# Altium integrated library vme6U_carrier_Cyc_V_SoC.IntLib: 56 symbols (continued)
## LQH32PN4R7NN0L
designator L?  value 4.7uH  (hidden comment: LQH32PN4R7NN0L)
Inductor, Fixed, 1210, 4.7uH, 216mOhm, 1A, 30%; Pkg: 1210; Vendor: Murata; Maintainer: Evgeniy Kotov; SMD Solders: 2; THD Solders: 0; DC Current: 750mA; Tolerance: 20%; DC Resistance: 380mΩ; PartField: LQH32PN4R7NN0L; Release Date: 30.03.2017; Last Change Data: 30.03.2017; Temperature Range: -40°C to +105°C
simulation model Inductor (Generic Inductor)
footprint IND_3225_MURATA_LQH_N (SMD Inductor, EIA 1206, Metric 3225,  Body Width 1.55mm, Body Lenght 3.2mm, Height 2.5mm)
footprint IND1608_COIL
pins: 1, 2

## MMBD1503
designator D?
High Conductance Low Leakage Diode; SolderOption: 0; Pkg: SOT-3N; SMD Solders: 3; HelpURL: https://www.engineering.uiowa.edu/sites/default/files/ees/files/NI/pdfs/01/30/DS013013.pdf; Value: MMBD1503; PartField: MMBD1503; THD Solders: 0
footprint SOT95P280X115-3N (SOT23, 0.95mm, pitch;3 pin,1.55mm W X 2.95mm L X 1.15mm H body, IPC Medium Density)
pins: 1, 2, 3

## MOLEX-74441-0001
designator J?, comment 74441-0001
CONN SFP+ RCPT 20POS SLD R/A SMD; Pkg: SMD SFP conn; SMD Solders: 20; THD Solders: 0; RoHSCompliant: True; ComponentLink3URL: http://www.molex.com/pdm_docs/sd/747540101_sd.pdf; Width: 49 mm; Height: 10.85 mm; Mounting Technology: Through Hole; ComponentLink2Description: Datasheet; ComponentLink3Description: Package Specification; DatasheetVersion: Rev. Jul-15; Package Quantity: 1152; PackageDescription: CONN SFP+ RCPT 20POS SLD R/A SMD; Radiation Hardening: No; PackageVersion: Rev. J, 02/2015; ComponentLink1Description: Manufacturer URL; PartNumber: 74441-0001; ComponentLink1URL: http://www.molex.com/; Packaging: Tray; Length: 15.9 mm; ComponentLink2URL: http://www.molex.com/webdocs/datasheets/pdf/en-us/0747540101_IO_CONNECTORS.pdf; Value: 74441-0001; PartField: 74441-0001
footprint MOLEX_74441-0001 (20 Position, Pitch 0.8mm SFP+ Receptacle (Small Form-factor Pluggable))
pins: 1 GND, 2 TxFault (out), 3 TxDis, 4 SDA, 5 SCL, 6 ~{Mod}Abs (out), 7 RS0(RX), 8 RxLos (out), 9 RS1(TX), 10 GND, 11 GND, 12 RD-, 13 RD+, 14 GND, 15 VCCR, 16 VCCT, 17 GND, 18 TD+, 19 TD-, 20 GND

## MOLX-74754-0101
designator J?, comment 74754-0101
SFP+ Cage, Single Port, Height 10.85 mm, Tail Height 3.05 mm, -40 to 85 degC, RoHS, Tray; Pkg: SFP cage; SMD Solders: 0; THD Solders: 20; RoHSCompliant: True; ComponentLink3URL: http://www.molex.com/pdm_docs/sd/747540101_sd.pdf; Width: 49 mm; Height: 10.85 mm; Mounting Technology: Through Hole; ComponentLink2Description: Datasheet; ComponentLink3Description: Package Specification; DatasheetVersion: Rev. Jul-15; Package Quantity: 1152; PackageDescription: SFP+ Cage, Single Port, Height 10.85 mm, Tail Height 3.05 mm; Radiation Hardening: No; PackageVersion: Rev. J, 02/2015; ComponentLink1Description: Manufacturer URL; PartNumber: 74754-0101; ComponentLink1URL: http://www.molex.com/; Packaging: Tray; Length: 15.9 mm; ComponentLink2URL: http://www.molex.com/webdocs/datasheets/pdf/en-us/0747540101_IO_CONNECTORS.pdf; Value: 74754-0101; PartField: 74754-0101
footprint MOLEX_74737-0111 (SFP+ 1x1 Cage)
pins: 1, 2, 3, 4, 5, 6, 7, 8, 9, 10, 11, 12, 13, 14, 15, 16, 17, 18, 19, 20

## MTFC32GAKAENA
designator U?, comment MTFC8GACAEDQ-AAT TR
Pkg: LBGA-100; SMD Solders: 100; THD Solders: 0; Value: MTFC8GACAEDQ-AAT TR; PartField: MTFC8GACAEDQ-AAT TR
footprint BGA100C100P10X17_1400X1800X120 (BGA 100 ball for e*MMC)
part A pins: K2 DAT0, K3 DAT2, K5 DS, K8 DAT4, K9 DAT7, M5 ~{RST}, N2 DAT1, N3 DAT3, N8 DAT4, N9 DAT6, P5 CMD, P6 CLK
part B pins: E4 VDDI, F2 VCC, F3 VCC, F4 VCC, F5 VCC, F6 VCC, F7 VCC, F8 VCC, F9 VCC, G2 GND, G3 GND, G4 GND, G5 GND, G6 GND, G7 GND, G8 GND, G9 GND, H2 GNDQ, H3 VCCQ, H8 VCCQ, H9 GNDQ, J5 GND, L2 VCCQ, L3 GNDQ, L4 VCCQ, L7 VCCQ, L8 GNDQ, L9 VCCQ, M4 GNDQ, M7 GNDQ, P2 GNDQ, P3 VCCQ, P8 VCCQ, P9 GNDQ
part C pins: A1 NC, A2 NC, A9 NC, A10 NC, B1 NC, B10 NC, D2 RFU, D3 RFU, D4 RFU, D5 RFU, D6 RFU, D7 RFU, D8 RFU, D9 RFU, E2 RFU, E3 RFU, E5 RFU, E6 RFU, E7 RFU, E8 RFU, E9 RFU, H4 RFU, H5 RFU, H6 RFU, H7 RFU, J2 RFU, J3 RFU, J4 RFU, J6 RFU, J7 RFU, J8 RFU, J9 RFU, K4 RFU, K6 RFU, K7 RFU, L5 RFU, L6 RFU, M2 RFU, M3 RFU, M6 RFU, M8 RFU, M9 RFU, N4 RFU, N5 RFU, N6 RFU, N7 RFU, P4 RFU, P7 RFU, T1 NC, T10 NC, U1 NC, U2 NC, U9 NC, U10 NC

## PCA9534PW
designator U?
8-Bit I2C-Bus and SMBus Low Power I/O Port with Interrupt; Manufacturer: ANALOG DEVICES; PressFit: No; Bonding: No; Pkg: SSOP16; SMD Solders: 16; THD Solders: 0; Part Number: PCA9534PW; Component Kind: Standard; Component Type: Standard; Device: PCA9534PW; Footprint: SOP65P640X110-16N; PackageDescription: SOP, 0.65mm pitch; 16 pin, 4.40mm W X 5.00mm L X 1.10mm H body IPC Medium Density; Part Description: 8-Bit I2C-Bus and SMBus Low Power I/O Port with Interrupt; Manufacturer Part Number: PCA9534PW; Pin Count: 16; Case: SSOP16; Mounted: Yes; Socket: No; SMD: Yes; ComponentHeight: 1.1mm; Author: CERN DEM JLC; HelpURL: \\cern.ch\dfs\Applications\Altium\Datasheets\PCA9534PW.pdf; CreateDate: 18/12/2013; LatestRevisionDate: 18/12/2013; Sense: No; Value: PCA9534PW; PartField: PCA9534PW
footprint SOP65P640X110-16N
pins: 1 A0 (in), 2 A1 (in), 3 A2 (in), 4 IO0 (io), 5 IO1 (io), 6 IO2 (io), 7 IO3 (io), 8 VSS (power), 9 IO4 (io), 10 IO5 (io), 11 IO6 (io), 12 IO7 (io), 13 ~{INT} (out), 14 SCL (in), 15 SDA (io), 16 VDD (io)

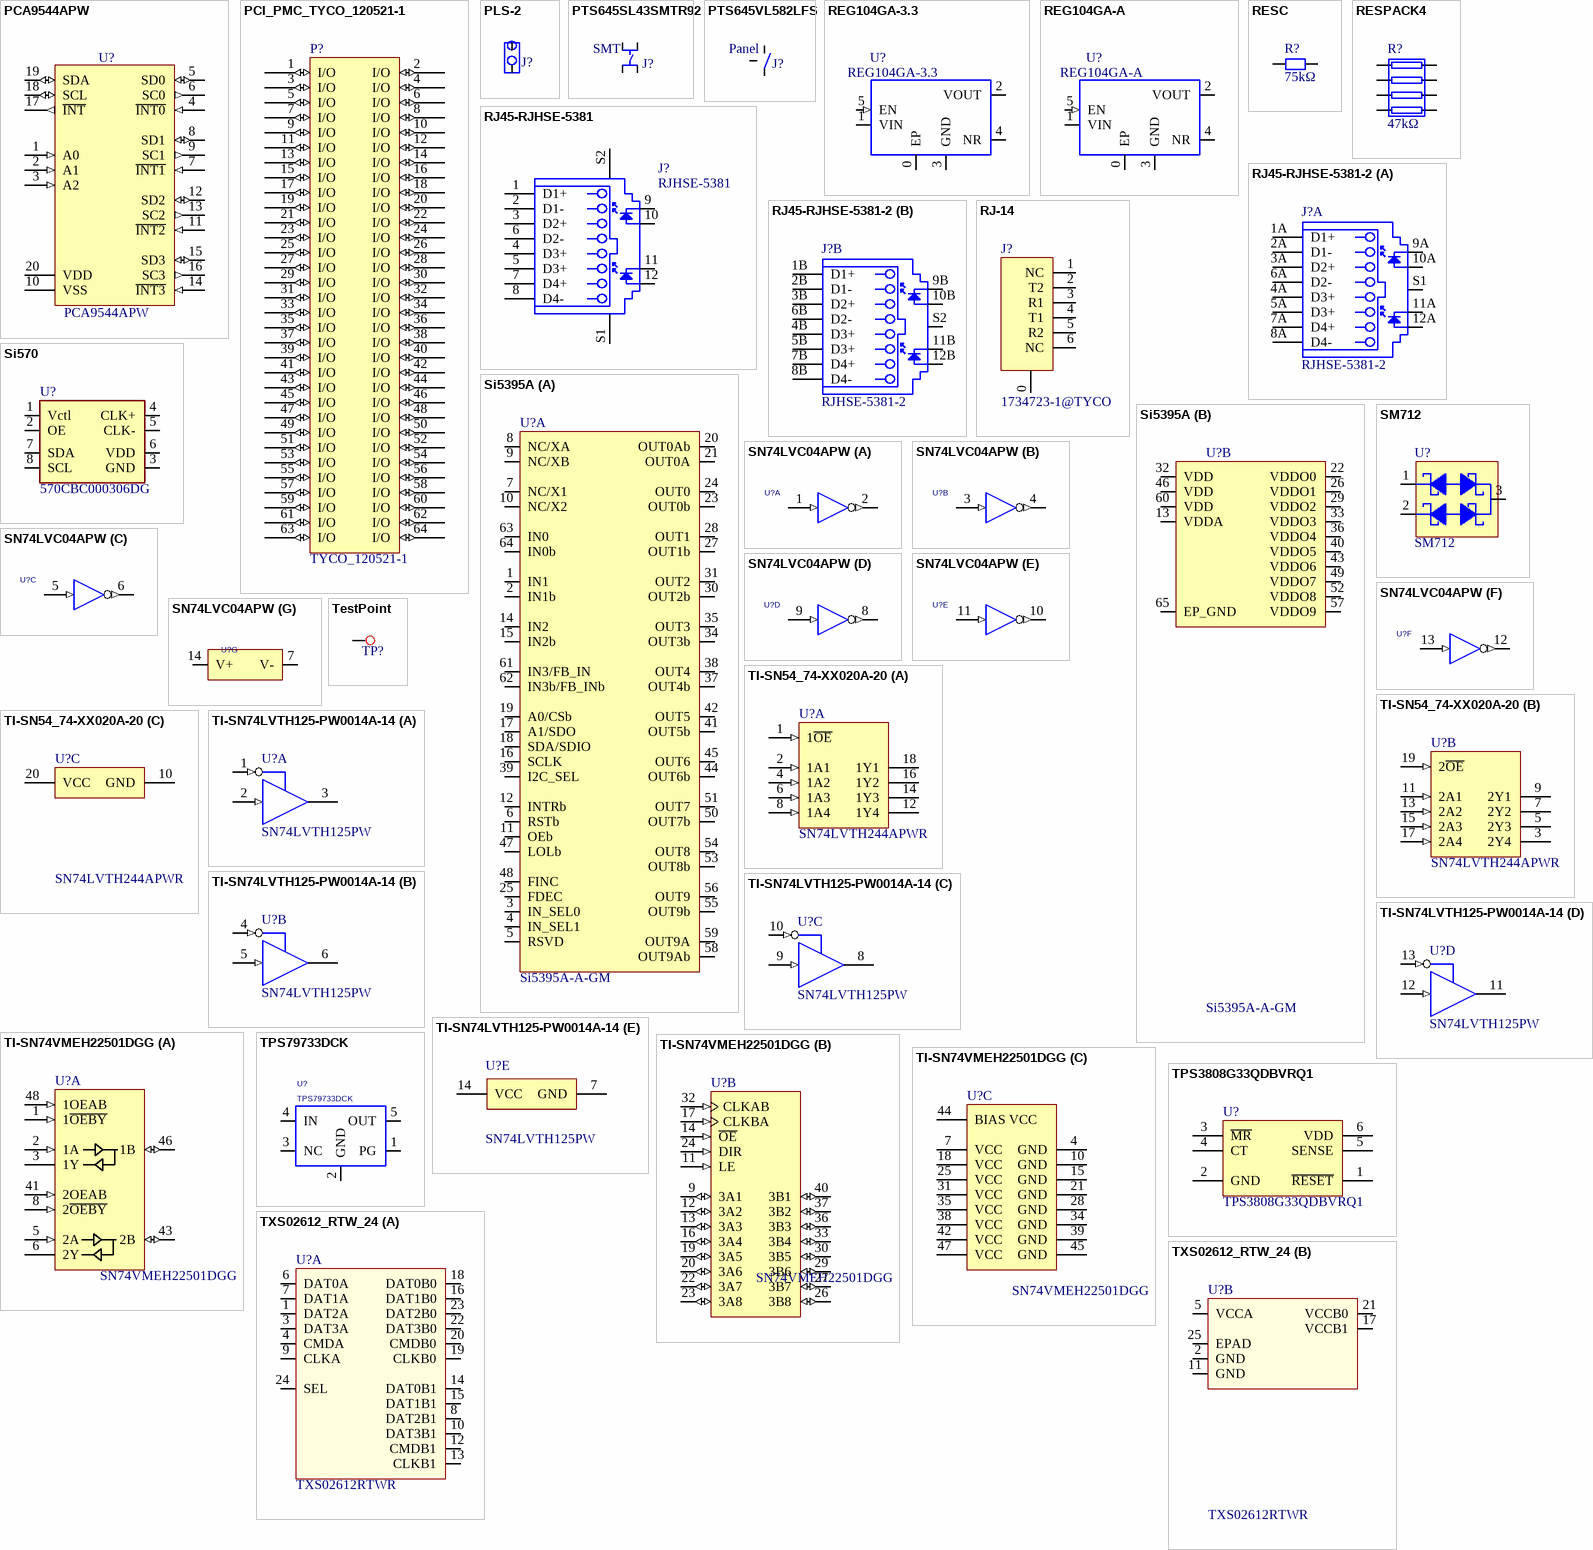
[diagram p3: symbols PCA9544APW to TXS02612_RTW_24]

## PCA9544APW
designator U?
4-Channel I2C-Bus Multiplexer with Interrupt Logic; Manufacturer: NXP SEMICONDUCTORS; PressFit: No; Bonding: No; Pkg: SSOP20; SMD Solders: 20; THD Solders: 0; Part Number: PCA9544APW; Component Kind: Standard; Component Type: Standard; Device: PCA9544APW; Footprint: SOP65P640X110-20N; PackageDescription: SOP, 20-Leads, Body 6.6x4.5mm (max), Pitch 0.65mm, IPC Medium Density; Part Description: 4-Channel I2C-Bus Multiplexer with Interrupt Logic; Manufacturer Part Number: PCA9544APW; Pin Count: 20; Case: SSOP20; Mounted: Yes; Socket: No; SMD: Yes; ComponentHeight: 1.1mm; Author: CERN DEM JLC; HelpURL: \\cern.ch\dfs\Applications\Altium\Datasheets\PCA9544APW.pdf; CreateDate: 06/10/2014; LatestRevisionDate: 06/10/2014; Sense: No; Value: PCA9544APW; PartField: PCA9544APW
footprint SOP65P640X110-20N
pins: 1 A0 (in), 2 A1 (in), 3 A2 (in), 4 ~{INT0} (in), 5 SD0 (io), 6 SC0 (out), 7 ~{INT1} (in), 8 SD1 (io), 9 SC1 (out), 10 VSS (power), 11 ~{INT2} (in), 12 SD2 (io), 13 SC2 (out), 14 ~{INT3} (in), 15 SD3 (io), 16 SC3 (out), 17 ~{INT} (out), 18 SCL (io), 19 SDA (io), 20 VDD (power)

## PCI_PMC_TYCO_120521-1
designator P?, comment TYCO_120521-1
PCI Mezzanine Connector; IEEE 1386; Manufacturer: TE Connectivity; Value: DNP; SMD Solders: 64; THD Solders: 0; Pkg: SMD 64 pin; PartField: TYCO_120521-1
footprint TYCO_120521-1 (2x32 Position, 1mm Centerline, Surface Mount, Stacking Board-to-Board Female Connector (IEEE 1386 Mezzanine Connector))
pins: 1 I/O (io), 2 I/O (io), 3 I/O (io), 4 I/O (io), 5 I/O (io), 6 I/O (io), 7 I/O (io), 8 I/O (io), 9 I/O (io), 10 I/O (io), 11 I/O (io), 12 I/O (io), 13 I/O (io), 14 I/O (io), 15 I/O (io), 16 I/O (io), 17 I/O (io), 18 I/O (io), 19 I/O (io), 20 I/O (io), 21 I/O (io), 22 I/O (io), 23 I/O (io), 24 I/O (io), 25 I/O (io), 26 I/O (io), 27 I/O (io), 28 I/O (io), 29 I/O (io), 30 I/O (io), 31 I/O (io), 32 I/O (io), 33 I/O (io), 34 I/O (io), 35 I/O (io), 36 I/O (io), 37 I/O (io), 38 I/O (io), 39 I/O (io), 40 I/O (io), 41 I/O (io), 42 I/O (io), 43 I/O (io), 44 I/O (io), 45 I/O (io), 46 I/O (io), 47 I/O (io), 48 I/O (io), 49 I/O (io), 50 I/O (io), 51 I/O (io), 52 I/O (io), 53 I/O (io), 54 I/O (io), 55 I/O (io), 56 I/O (io), 57 I/O (io), 58 I/O (io), 59 I/O (io), 60 I/O (io), 61 I/O (io), 62 I/O (io), 63 I/O (io), 64 I/O (io)

## PLS-2
designator J?  (value not drawn)
Connector, 5x2, Male, 2.54mm Pitch, Right Angle; SMD Solders: 0; THD Solders: 2; Maintainer: Evgeniy Kotov; PartField: PLS-2; Last Change Data: 02.04.2017; Release Date: 02.04.2017; Value: PLS-2; ComponentLink1Description: Datasheet; Pkg: PLS-2
footprint PLS-2 (2 Contacts - Pitch 2.54mm - Single Row Straight Strip Male Header)
pins: 1, 2
1 alternate drawing of the same symbol

## PTS645SL43SMTR92
designator J?  (value not drawn)
Tactile Switch SPST-NO Top Actuated Surface Mount; SMD Solders: 4; THD Solders: 0; Maintainer: Evgeniy Kotov; Pkg: Button 4 pin; PartField: PTS645SL43SMTR92; Last Change Data: 02.04.2017; Release Date: 02.04.2017; Value: PTS645SL43SMTR92; ComponentLink1Description: Datasheet
footprint PTS645SL43SMTR92
pins: 1, 2, 3, 4
1 alternate drawing of the same symbol
text: SMT

## PTS645VL582LFS
designator J?  (value not drawn)
Tactile Switch SPST-NO Side Actuated Through Hole, Right Angle; SMD Solders: 0; THD Solders: 4; Maintainer: Evgeniy Kotov; Pkg: Button 4 pin; PartField: PTS645VL582LFS; Last Change Data: 02.04.2017; Release Date: 02.04.2017; Value: PTS645VL582LFS; ComponentLink1Description: Datasheet
footprint PTS645VL582LFS (Tactile Switches SWITCH TACTILE)
pins: 0 S, 1, 2
1 alternate drawing of the same symbol
text: Panel

## REG104GA-3.3
designator U?
Single Output LDO, 1.0A, Fixed (3.3V), Low Noise, Fast Transient Response; Manufacturer: Texas Instruments; Manufacturer_Part_Number: reg104-33_dcq_6; INDUSTRY_STD_PKG_TYPE: SOT-223; FAMILY_NAME: SINGLE CHANNEL LDO; PIN_COUNT: 6; PACKAGE_DESIGNATOR: DCQ; Pkg: SOT-5EP; THD Solders: 0; Value: REG104GA-3.3; Datasheet URL: http://www.ti.com/lit/gpn/REG104-A; GENERIC_PART_NUMBER: REG104GA-3.3; Vendor: Texas Instruments; SMD Solders: 6; PartField: REG104GA-3.3
footprint SOT223 (5 pin with thermal pad)
pins: 0 EP, 1 VIN (power), 2 VOUT (power), 3 GND (power), 4 NR, 5 EN (in)

## REG104GA-A
designator U?
Single Output LDO, 1.0A, Adj.(1.295 to 5.5V), Low Noise, Fast Transient Response; Manufacturer: Texas Instruments; Manufacturer_Part_Number: reg104-a_dcq_6; INDUSTRY_STD_PKG_TYPE: SOT-223; FAMILY_NAME: SINGLE CHANNEL LDO; PIN_COUNT: 6; PACKAGE_DESIGNATOR: DCQ; Pkg: SOT-5EP; THD Solders: 0; Value: REG104GA-A; Datasheet URL: http://www.ti.com/lit/gpn/REG104-A; GENERIC_PART_NUMBER: REG104GA-A; Vendor: Texas Instruments; SMD Solders: 6; PartField: REG104GA-A
footprint SOT223 (5 pin with thermal pad)
pins: 0 EP, 1 VIN (power), 2 VOUT (power), 3 GND (power), 4 NR, 5 EN (in)

## RESC
designator R?, comment 75kΩ
Resistor, Generic, SMD; Pkg: 0805; Maintainer: Evgeniy Kotov; SMD Solders: 2; THD Solders: 0; PartField: 75kΩ; Release Date: 06.03.2017; Last Change Data: 09.03.2017; Value: 75kΩ
footprint RESC2012N (Chip Resistor, EIA 0805, Metric 2012, Body 2.0x1.2mm, IPC Medium Density)
simulation model Resistor (Generic Resistor)
footprint RESC1608N (Chip Resistor, EIA 0603, Metric 1608, Body 1.6x0.8mm, IPC Medium Density)
pins: 1, 2

## RESPACK4
designator R?, comment value 47kΩ  (hidden comment: CAY16-4702F4LF)
Maintainer: Anton Pavlenko; Pkg: SMD 8pin; SMD Solders: 8; THD Solders: 0; PartField: CAY16-4702F4LF; Last Change Data: 16.05.2019; Release Date: 16.05.2019
footprint CAY16-J4
pins: 1, 2, 3, 4, 5, 6, 7, 8

## RJ45-RJHSE-5381
designator J?, comment RJHSE-5381
High Speed RJ45, Modular Jack, 8 Position, 8 Contacts, Shielded, with LEDs, -55 to 85 degC,12-Pin THD, RoHS, Tray; Manufacturer: Amphenol; Number of Positions/Contacts: 8p8c(RJ45,Ethernet); Number of Ports: 1; Catalog Drawings: RJ45SeriesRightAngle; PCN Design/Specification: MultipleSeriesCopper29/Jan/2009RJHSEShieldMaterial30/Jun/2015; Other Names: RJHSE5381; Online Catalog: RJHSESeries; Featured Product: ModularJacksProductSolutions; Tab Direction: Up; Shielding: Shielded,EMIFinger; LED Color: Yellow-Green; 3D Model: RJHSE538x.stpRJHSE538x.igs; Pkg: LAN conn; SMD Solders: 0; THD Solders: 14; Category: Connectors,Interconnects; Termination: Solder; Housing Material: Thermoplastic; Mounting Type: ThroughHole; Family: ModularConnectors-Jacks; Orientation: 90°Angle(Right); Features: BoardLock; Contact Material: PhosphorBronze; Mounting Technology: ThroughHole; Number of Rows: 1; Standard Package: 120; Ratings: -; Operating Temperature: -55°C~85°C; Series: RJHSE; Contact Finish: Gold; Package Reference: RJHSE-5381; Ingress Protection: -; Package Description: 12-Pin Through Hole Device, Body 16.51 x 15.75 mm; Contact Finish Thickness: 50µin(1.27µm); Datasheet URL: https://datasheet.ciiva.com/16481/rjhse538x-16481714.pdf; Datasheet Version: Rev. K, 04/2014; Connector Type: Jack; Manufacturer URL: http://www.amphenol.com/; Packaging: Tray; PartField: RJHSE-5381; Value: RJHSE-5381
footprint AMPH-RJHSE-5381_V (THD, 12-Leads, Body 16.51x15.75mm)
pins: 1 D1+, 2 D1-, 3 D2+, 4 D3+, 5 D3+, 6 D2-, 7 D4+, 8 D4-, 9, 10, 11, 12, S1, S2

## RJ45-RJHSE-5381-2
designator J?, comment RJHSE-5381-2
Dual Port, High Speed RJ45, Modular Jack, 8 Position, 8 Contacts, Shielded, with LEDs, -55 to 85 degC,12-Pin THD, RoHS, Tray; Manufacturer: Amphenol; Number of Positions/Contacts: 8p8c(RJ45,Ethernet); Number of Ports: 1; Catalog Drawings: RJ45SeriesRightAngle; PCN Design/Specification: MultipleSeriesCopper29/Jan/2009RJHSEShieldMaterial30/Jun/2015; Other Names: RJHSE5381; Online Catalog: RJHSESeries; Featured Product: ModularJacksProductSolutions; Tab Direction: Up; Shielding: Shielded,EMIFinger; LED Color: Yellow-Green; 3D Model: RJHSE538x.stpRJHSE538x.igs; Pkg: LAN x2; SMD Solders: 0; THD Solders: 28; Category: Connectors,Interconnects; Termination: Solder; Housing Material: Thermoplastic; Mounting Type: ThroughHole; Family: ModularConnectors-Jacks; Orientation: 90°Angle(Right); Features: BoardLock; Contact Material: PhosphorBronze; Mounting Technology: ThroughHole; Number of Rows: 1; Standard Package: 120; Ratings: -; Operating Temperature: -55°C~85°C; Series: RJHSE; Contact Finish: Gold; Package Reference: RJHSE-5381; Ingress Protection: -; Package Description: 12-Pin Through Hole Device, Body 16.51 x 15.75 mm; Contact Finish Thickness: 50µin(1.27µm); Datasheet URL: https://datasheet.ciiva.com/16481/rjhse538x-16481714.pdf; Datasheet Version: Rev. K, 04/2014; Connector Type: Jack; Manufacturer URL: http://www.amphenol.com/; Packaging: Tray; PartField: RJHSE-5381-2; Value: RJHSE-5381-2
footprint AMPH-RJHSE-5381-02_V
part A pins: 1A D1+, 2A D1-, 3A D2+, 4A D3+, 5A D3+, 6A D2-, 7A D4+, 8A D4-, 9A 9, 10A 10, 11A 11, 12A 12, S1
part B pins: 1B D1+, 2B D1-, 3B D2+, 4B D3+, 5B D3+, 6B D2-, 7B D4+, 8B D4-, 9B 9, 10B 10, 11B 11, 12B 12, S2

## RJ-14
designator J?, comment 1734723-1@TYCO
Pkg: RJ14-6p; SMD Solders: 0; THD Solders: 10; PartField: 1734723-1@TYCO; Value: 1734723-1@TYCO
footprint RJ14
pins: 0, 1 NC, 2 T2, 3 R1, 4 T1, 5 R2, 6 NC

## Si570
designator U?, comment 570CBC000306DG
XTAL OSCILLATOR SMD; Manufacturer: Silicon Labs; Manufacturer Part Number: 541AAA001040BAGR; Min Supply Voltage: 2.375V; Max Supply Voltage: 3.465V; Pkg: SMD 6pin; Frequency: 0.2-1500MHz; Nominal Supply Current: 100mA; Maintainer: Evgeniy Kotov; SMD Solders: 6; THD Solders: 0; Value: Si570; Device Class L2: Clock and Timing; ComponentLink2Description: Datasheet; RoHS: TRUE; Device Class L1: Integrated Circuits (ICs); Height: 1.33mm; Octopart: https://octopart.com/541aaa001040bagr-silicon+labs-103392146; ComponentLink2URL: https://www.silabs.com/documents/public/data-sheets/si541-datasheet.pdf; Temperature Range High: +85°C; Category: IC; Ambient Temperature Range High: +85°C; Digikey Description: XTAL OSCILLATOR SMD; Lead Free: Yes; Ambient Temperature Range Low: -40°C; Device Class L3: Timers and Oscillators; Automotive: No; Temperature: -40°C to +85°C; Temperature Range Low: -40°C; Last Change Data: 09.03.2017; PartField: 570CBC000306DG
footprint FP-57x-MFG
pins: 1 Vctl, 2 OE, 3 GND (power), 4 CLK+, 5 CLK-, 6 VDD (power), 7 SDA (power), 8 SCL (power)

## Si5395A
designator U?, comment Si5395A-A-GM
Manufacturer: SiLabs; SMD Solders: 65; THD Solders: 0; Pkg: QFN-64EP; PartField: Si5395A-A-GM; Value: Si5395A; Vendor: SiLabs
footprint QFN50P900X900X100-65N-S530
part A pins: 1 IN1, 2 IN1b, 3 IN_SEL0, 4 IN_SEL1, 5 RSVD, 6 RSTb, 7 NC/X1, 8 NC/XA, 9 NC/XB, 10 NC/X2, 11 OEb, 12 INTRb, 14 IN2, 15 IN2b, 16 SCLK, 17 A1/SDO, 18 SDA/SDIO, 19 A0/CSb, 20 OUT0Ab, 21 OUT0A, 23 OUT0b, 24 OUT0, 25 FDEC, 27 OUT1b, 28 OUT1, 30 OUT2b, 31 OUT2, 34 OUT3b, 35 OUT3, 37 OUT4b, 38 OUT4, 39 I2C_SEL, 41 OUT5b, 42 OUT5, 44 OUT6b, 45 OUT6, 47 LOLb, 48 FINC, 50 OUT7b, 51 OUT7, 53 OUT8b, 54 OUT8, 55 OUT9b, 56 OUT9, 58 OUT9Ab, 59 OUT9A, 61 IN3/FB_IN, 62 IN3b/FB_INb, 63 IN0, 64 IN0b
part B pins: 13 VDDA, 22 VDDO0, 26 VDDO1, 29 VDDO2, 32 VDD, 33 VDDO3, 36 VDDO4, 40 VDDO5, 43 VDDO6, 46 VDD, 49 VDDO7, 52 VDDO8, 57 VDDO9, 60 VDD, 65 EP_GND

## SM712
designator U?
Pkg: SOT23-3; SMD Solders: 3; THD Solders: 0; Vendor: SemTech; ComponentLink1Description: Datasheet; ComponentLink1URL: https://static.chipdip.ru/lib/081/DOC001081416.pdf; Last Change Data: 05.03.2020; PartField: SM712; Value: SM712
footprint SOT95P240X110-3N (SOT23 3-Leads, Pitch 0.95mm - Body 1.3x2.9mm, IPC Medium Density)
pins: 1, 2, 3

## SN74LVC04APW
designator U?  (value not drawn)
Sextuple NOR Gate; Manufacturer: Texas Instruments; INDUSTRY_STD_PKG_TYPE: TSSOP; FAMILY_NAME: NOR_GATE; PIN_COUNT: 14; PACKAGE_DESIGNATOR: PW; Pkg: PW-14; THD Solders: 0; Value: SN74LVC04APW; HelpURL: http://www.ti.com/lit/ds/symlink/sn74lvc04a.pdf; GENERIC_PART_NUMBER: SN74LVC04APW; Vendor: Texas Instruments; Manufacturer_Part_Number: SN74LVC04APW; SMD Solders: 14; PartField: SN74LVC04APW
footprint SOP65P640X110-14N (SOP, 14-Leads, Body 4.4x5mm (max), Pitch 0.65mm, IPC Medium Density)
part A pins: 1 A (in), 2 B (out)
part B pins: 3 A (in), 4 B (out)
part C pins: 5 A (in), 6 B (out)
part D pins: 8 B (out), 9 A (in)
part E pins: 10 B (out), 11 A (in)
part F pins: 12 B (out), 13 A (in)
part G pins: 7 V-, 14 V+

## TestPoint
designator TP?, comment test point  (value not drawn)  (no BOM)
testPoint; Vendor: BINP; SolderOption: 0; Pkg: DNP; PartField: test point; Value: test point; SMD Solders: 0; THD Solders: 0
footprint TEST_POINT (test point)
pins: 1

## TI-SN54_74-XX020A-20
designator U?, comment SN74LVTH244APWR
3.3-V ABT Octal Buffers/Drivers With 3-State Outputs, PW0020A, LARGE T&R; Manufacturer: Texas Instruments; Voltage(Nom)(V): 3.3; ICC @ Nom Voltage(Max)(mA): 0.005; tpd @ Nom Voltage(Max)(ns): 3.5; Input Type: TTL; VCC(Max)(V): 3.6; Rating: Catalog; VCC(Min)(V): 2.7; Bits(#): 8; F @ Nom Voltage(Max)(Mhz): 160; Output Type: LVTTL; Pkg: TSSOP-20N; SMD Solders: 20; THD Solders: 0; DatasheetVersion: SCAS586J; Generic Part Number: SN74LVTH244A; PackageReference: PW0020A; Operating Temperature Range(C): -40 to 85; Code_JEDEC: MO-153; PackageVersion: http://www.ti.com/lit/ml/mpds362/mpds362.pdf; PartId: 1; PartField: SN74LVTH244A; Value: SN74LVTH244A
footprint PW0020A_L (SOP, 20-Leads, Body 6.6x4.5mm, Pitch 0.65mm, IPC High Density)
footprint PW0020A_M (SOP, 20-Leads, Body 6.6x4.5mm, Pitch 0.65mm, IPC Low Density)
footprint PW0020A_N (SOP, 20-Leads, Body 6.6x4.5mm, Pitch 0.65mm, IPC Medium Density)
part A pins: 1 1~{OE} (in) "Output Enable 1", 2 1A1 (in) "1A1 Input", 4 1A2 (in) "1A2 Input", 6 1A3 (in) "1A3 Input", 8 1A4 (in) "1A4 Input", 12 1Y4 (hiz) "1Y4 Output", 14 1Y3 (hiz) "1Y3 Output", 16 1Y2 (hiz) "1Y2 Output", 18 1Y1 (hiz) "1Y1 Output"
part B pins: 3 2Y4 (hiz) "2Y4 Output", 5 2Y3 (hiz) "2Y3 Output", 7 2Y2 (hiz) "2Y2 Output", 9 2Y1 (hiz) "2Y1 Output", 11 2A1 (in) "2A1 Input", 13 2A2 (in) "2A2 Input", 15 2A3 (in) "2A3 Input", 17 2A4 (in) "2A4 Input", 19 2~{OE} (in) "Output Enable 2"
part C pins: 10 GND (power) "Ground Pin", 20 VCC (power) "Power Pin"

## TI-SN74LVTH125-PW0014A-14
designator U?, comment SN74LVTH125PW
3.3-V ABT Quadruple Bus Buffers With 3-State Outputs, PW0014A, TUBE; Manufacturer: Texas Instruments; ICC @ Nom Voltage(Max)(mA): 0.007; Rating: Catalog; VCC(Min)(V): 2.7; F @ Nom Voltage(Max)(Mhz): 160; VCC(Max)(V): 3.6; Voltage(Nom)(V): 3.3; tpd @ Nom Voltage(Max)(ns): 3.5; Output Type: CMOS; Bits(#): 4; Input Type: TTL; Pkg: TSSOP-14N; SMD Solders: 14; THD Solders: 0; PackageReference: PW0014A; DatasheetVersion: SCBS703I; Operating Temperature Range(C): -40 to 85; PackageVersion: http://www.ti.com/lit/ml/mpds360/mpds360.pdf; Generic Part Number: SN74LVTH125; Code_JEDEC: MO-153; PartField: SN74LVTH125; Value: SN74LVTH125
footprint PW0014A_L (SOP, 14-Leads, Body 5.1x4.5mm, Pitch 0.65mm, IPC High Density)
footprint PW0014A_M (SOP, 14-Leads, Body 5.1x4.5mm, Pitch 0.65mm, IPC Low Density)
footprint PW0014A_N (SOP, 14-Leads, Body 5.1x4.5mm, Pitch 0.65mm, IPC Medium Density)
part A pins: 1 1~{OE} (in), 2 1A (in), 3 1Y (hiz)
part B pins: 4 2~{OE} (in), 5 2A (in), 6 2Y (hiz)
part C pins: 8 3Y (hiz), 9 3A (in), 10 3~{OE} (in)
part D pins: 11 4Y (hiz), 12 4A (in), 13 4~{OE} (in)
part E pins: 7 GND (power), 14 VCC (power)

## TI-SN74VMEH22501DGG
designator U?, comment SN74VMEH22501DGG
8-Bit Universal Bus Transceiver and Two 1-Bit Bus Transceivers with 3-State Outputs, DGG, TUBE, 8.3mm; Manufacturer: Texas Instruments; Rating: Catalog; Logic: True; Input Type: LVTTL; Voltage(Nom)(V): 3.3; Schmitt Trigger: No; F @ Nom Voltage(Max)(Mhz): 120; VCC(Max)(V): 3.45; ICC @ Nom Voltage(Max)(mA): 30; VCC(Min)(V): 3.15; Bits(#): 10; Technology Family: VME; Output Drive (IOL/IOH)(Max)(mA): -12/12; tpd @ Nom Voltage(Max)(ns): 8.9; Pkg: TSSOP-48; SMD Solders: 48; THD Solders: 0; PackageReference: DGG0048A; Generic Part Number: SN74VMEH22501; ComponentLink2Description: Datasheet; ComponentLink1Description: Manufacturer URL; Operating Temperature Range(C): -40 to 85,0 to 85; ComponentLink1URL: http://www.ti.com/; DatasheetVersion: SCES357F; Output Type: LVTTL; Static Current: 30; PartNumber: SN74VMEH22501DGG; ComponentLink2URL: http://www.ti.com/lit/ds/symlink/sn74vmeh22501.pdf; PartField: SN74VMEH22501DGG; Value: SN74VMEH22501DGG
footprint DGG0048A_L
part A pins: 1 1~{OEBY} (in), 2 1A (in), 3 1Y (hiz), 5 2A (in), 6 2Y (hiz), 8 2~{OEBY} (in), 41 2OEAB (in), 43 2B (io), 46 1B (io), 48 1OEAB (in)
part B pins: 9 3A1 (io), 11 LE (in), 12 3A2 (io), 13 3A3 (io), 14 ~{OE} (in), 16 3A4 (io), 17 CLKBA (in), 19 3A5 (io), 20 3A6 (io), 22 3A7 (io), 23 3A8 (io), 24 DIR (in), 26 3B8 (io), 27 3B7 (io), 29 3B6 (io), 30 3B5 (io), 32 CLKAB (in), 33 3B4 (io), 36 3B3 (io), 37 3B2 (io), 40 3B1 (io)
part C pins: 4 GND (power), 7 VCC (power), 10 GND (power), 15 GND (power), 18 VCC (power), 21 GND (power), 25 VCC (power), 28 GND (power), 31 VCC (power), 34 GND (power), 35 VCC (power), 38 VCC (power), 39 GND (power), 42 VCC (power), 44 BIAS VCC (power), 45 GND (power), 47 VCC (power)

## TPS3808G33QDBVRQ1
designator U?
Low-Quiescent-Current Programmable-Delay Supervisory Circuit; Pkg: SOT23-6; SMD Solders: 6; THD Solders: 0; Maintainer: Evgeniy Kotov; Vendor: Texas Instruments; PartField: TPS3808G33QDBVRQ1; ComponentLink1URL: http://www.ti.com/lit/ds/symlink/dac7565.pdf; ComponentLink1Description: Datasheet; Last Change Date: 19.03.2017; Release Date: 19.03.2017; Value: TPS3808G33QDBVRQ1
footprint SOT95P280X100-6N (SOT23, 0.95mm pitch; 6 pin, 1.625mm W X 2.90mm L X 1.00mm H body, IPC Medium Density)
pins: 1 ~{RESET} "Reset", 2 GND, 3 ~{MR}, 4 CT "Reset period programming pin", 5 SENSE, 6 VDD

## TPS79733DCK
designator U?
Ultra low power (Iq=1.2 mkA) LDO 3.3V Fixed; Vendor: Texas Instruments; PACKAGE_DESIGNATOR: MF; PIN_COUNT: 5; INDUSTRY_STD_PKG_TYPE: SC70-5; THD Solders: 0; Value: TPS79733DCK; Manufacturer_Part_Number: TPS79733DCK; GENERIC_PART_NUMBER: TPS79733DCK; FAMILY_NAME: LDO; HelpURL: http://www.ti.com/lit/ds/symlink/tps797.pdf; Manufacturer: Texas Instruments; Pkg: SC70-5; SMD Solders: 5; PartField: TPS79733DCK
footprint SOT65P210X110-5N (SOT353, SC70-5, SOT, 0.65mm Pitch, 5 pin, 1.25mm W X 2.00mm L X 1.10mm H, IPC Medium Density)
pins: 1 PG, 2 GND (power), 3 NC, 4 IN, 5 OUT (power)

## TXS02612_RTW_24
designator U?, comment TXS02612RTWR
IC SDIO PORT EXPANDER AND LEVEL SHIFTER; Manufacturer_Part_Number: txs02612_rtw_24; Vendor: Texas Instruments; PACKAGE_DESIGNATOR: RTW; PIN_COUNT: 24; FAMILY_NAME: APPLICATION SPECIFIC (COMPACT FLASH, SD, MMC, I2C); INDUSTRY_STD_PKG_TYPE: QFN; Pkg: QFN-24EP; SMD Solders: 25; THD Solders: 0; GENERIC_PART_NUMBER: TXS02612RTWR; Datasheet URL: http://www.ti.com/lit/gpn/TXS02612; Manufacturer: Texas Instruments; RefDes: RefDes; Type: DEV; Value: TXS02612RTWR; PartField: TXS02612RTWR
footprint QFN50P400X400X80-25N-S245 (QFN, 0.50mm Pitch, Square; 6 Pin X 6 Pin, 4mm X 4mm Body (w/Thermal Tab 2.45 X 2.45 mm), IPC Medium Density)
part A pins: 1 DAT2A, 3 DAT3A, 4 CMDA, 6 DAT0A, 7 DAT1A, 8 DAT2B1, 9 CLKA, 10 DAT3B1, 12 CMDB1, 13 CLKB1, 14 DAT0B1, 15 DAT1B1, 16 DAT1B0, 18 DAT0B0, 19 CLKB0, 20 CMDB0, 22 DAT3B0, 23 DAT2B0, 24 SEL
part B pins: 2 GND, 5 VCCA, 11 GND, 17 VCCB1, 21 VCCB0, 25 EPAD

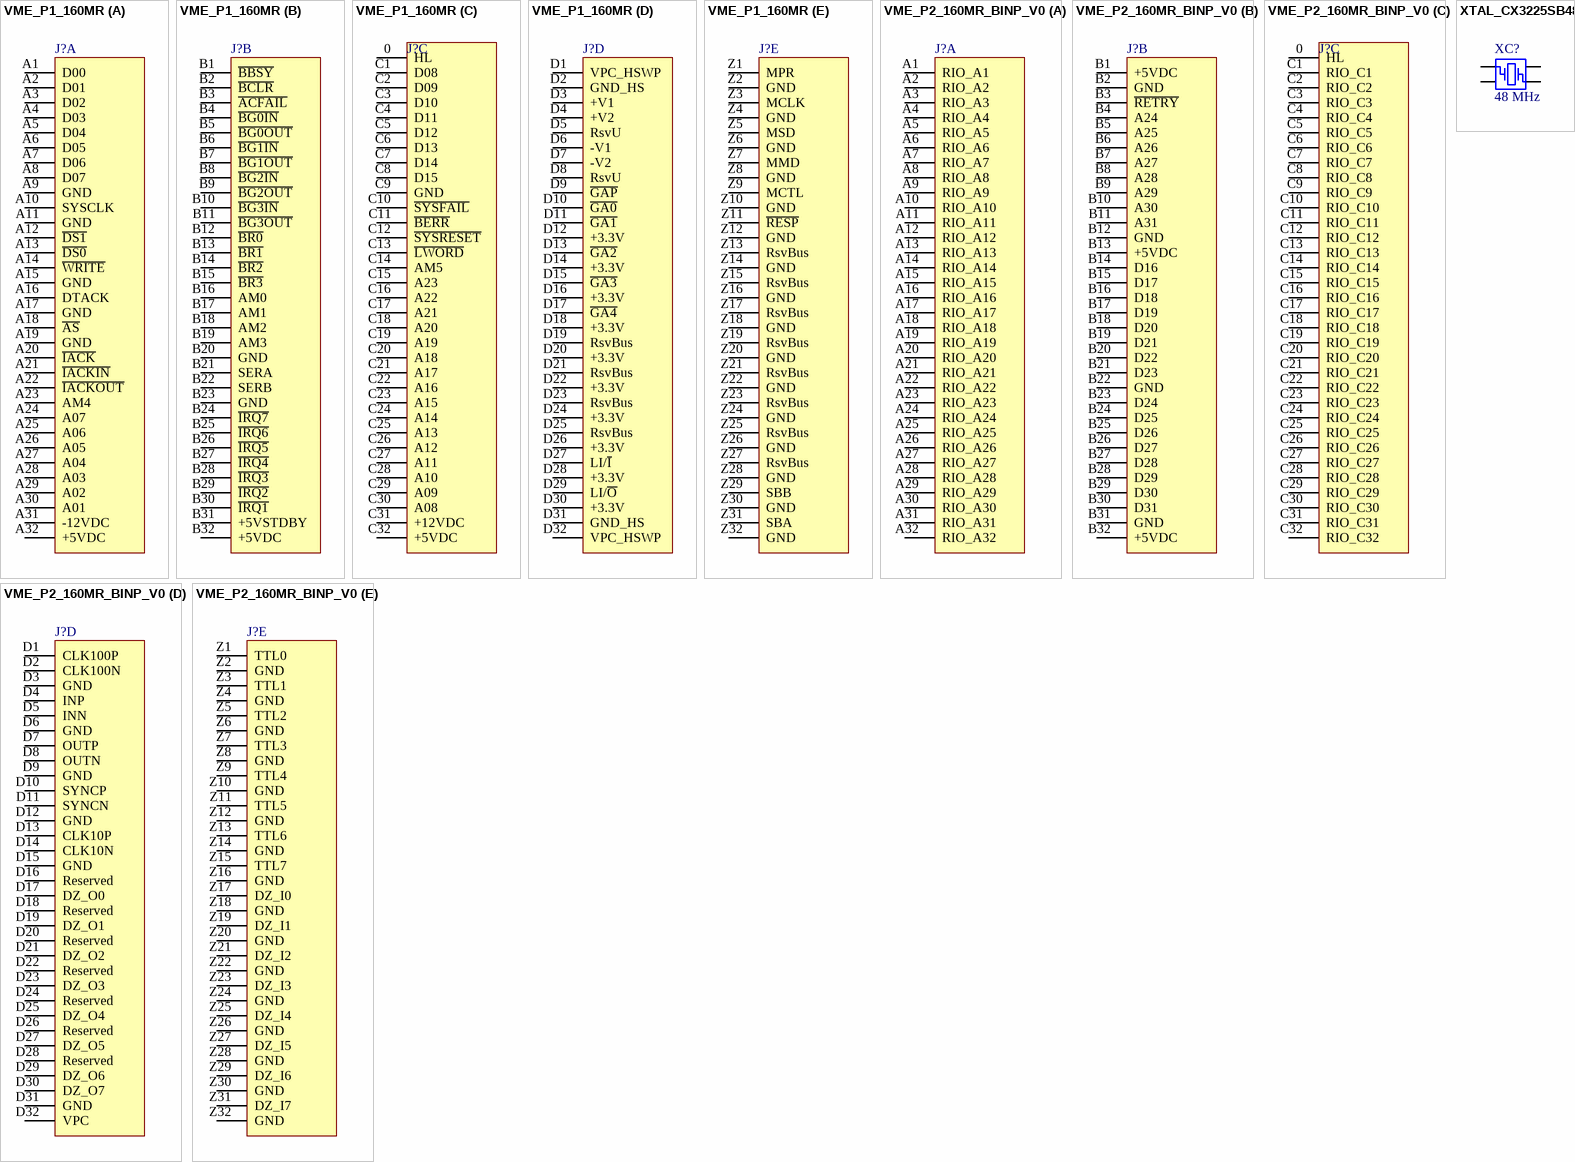
[diagram p4: symbols VME_P1_160MR to XTAL_CX3225SB48]

## VME_P1_160MR
designator J?, comment DIN41612_160MR  (value not drawn)
DIN 41612 5x32pin right angle male conector. VME P1 system connector; Value: VME_P1_160MR; Vendor: HARTING; SolderOption: 0; Vendor_Id: 09 03 196 6921; Pin_Count: 160; Pkg: TH 160pin; PartField: DIN41612_160MR; HelpURL: https://ru.mouser.com/Search/Refine?Keyword=617-09-03-196-6921; Supplier: https://ru.mouser.com/; Supplier_ID: 617-09-03-196-6921; SMD Solders: 0; THD Solders: 160
footprint DIN41612-160P
footprint VME_VXI
part A pins: A1 D00, A2 D01, A3 D02, A4 D03, A5 D04, A6 D05, A7 D06, A8 D07, A9 GND, A10 SYSCLK, A11 GND, A12 ~{DS1}, A13 ~{DS0}, A14 ~{WRITE}, A15 GND, A16 DTACK, A17 GND, A18 ~{AS}, A19 GND, A20 ~{IACK}, A21 ~{IACKIN}, A22 ~{IACKOUT}, A23 AM4, A24 A07, A25 A06, A26 A05, A27 A04, A28 A03, A29 A02, A30 A01, A31 -12VDC, A32 +5VDC
part B pins: B1 ~{BBSY}, B2 ~{BCLR}, B3 ~{ACFAIL}, B4 ~{BG0IN}, B5 ~{BG0OUT}, B6 ~{BG1IN}, B7 ~{BG1OUT}, B8 ~{BG2IN}, B9 ~{BG2OUT}, B10 ~{BG3IN}, B11 ~{BG3OUT}, B12 ~{BR0}, B13 ~{BR1}, B14 ~{BR2}, B15 ~{BR3}, B16 AM0, B17 AM1, B18 AM2, B19 AM3, B20 GND, B21 SERA, B22 SERB, B23 GND, B24 ~{IRQ7}, B25 ~{IRQ6}, B26 ~{IRQ5}, B27 ~{IRQ4}, B28 ~{IRQ3}, B29 ~{IRQ2}, B30 ~{IRQ1}, B31 +5VSTDBY, B32 +5VDC
part C pins: 0 HL, C1 D08, C2 D09, C3 D10, C4 D11, C5 D12, C6 D13, C7 D14, C8 D15, C9 GND, C10 ~{SYSFAIL}, C11 ~{BERR}, C12 ~{SYSRESET}, C13 ~{LWORD}, C14 AM5, C15 A23, C16 A22, C17 A21, C18 A20, C19 A19, C20 A18, C21 A17, C22 A16, C23 A15, C24 A14, C25 A13, C26 A12, C27 A11, C28 A10, C29 A09, C30 A08, C31 +12VDC, C32 +5VDC
part D pins: D1 VPC_HSWP, D2 GND_HS, D3 +V1, D4 +V2, D5 RsvU, D6 -V1, D7 -V2, D8 RsvU, D9 ~{GAP}, D10 ~{GA0}, D11 ~{GA1}, D12 +3.3V, D13 ~{GA2}, D14 +3.3V, D15 ~{GA3}, D16 +3.3V, D17 ~{GA4}, D18 +3.3V, D19 RsvBus, D20 +3.3V, D21 RsvBus, D22 +3.3V, D23 RsvBus, D24 +3.3V, D25 RsvBus, D26 +3.3V, D27 LI/~{I}, D28 +3.3V, D29 LI/~{O}, D30 +3.3V, D31 GND_HS, D32 VPC_HSWP
part E pins: Z1 MPR, Z2 GND, Z3 MCLK, Z4 GND, Z5 MSD, Z6 GND, Z7 MMD, Z8 GND, Z9 MCTL, Z10 GND, Z11 ~{RESP}, Z12 GND, Z13 RsvBus, Z14 GND, Z15 RsvBus, Z16 GND, Z17 RsvBus, Z18 GND, Z19 RsvBus, Z20 GND, Z21 RsvBus, Z22 GND, Z23 RsvBus, Z24 GND, Z25 RsvBus, Z26 GND, Z27 RsvBus, Z28 GND, Z29 SBB, Z30 GND, Z31 SBA, Z32 GND

## VME_P2_160MR_BINP_V0
designator J?, comment DIN41612_160MR  (value not drawn)
DIN 41612 5x32pin right angle male conector. VME P2 system connector, VME BINP synch support; Value: VME_P2_160MR; Vendor: HARTING; SolderOption: 0; Vendor_Id: 09 03 196 6921; Pin_Count: 160; Pkg: TH 160pin; PartField: DIN41612_160MR; HelpURL: https://ru.mouser.com/Search/Refine?Keyword=617-09-03-196-6921; Supplier: https://ru.mouser.com/; Supplier_ID: 617-09-03-196-6921; SMD Solders: 0; THD Solders: 160
footprint DIN41612-160P
footprint VME_VXI
part A pins: A1 RIO_A1, A2 RIO_A2, A3 RIO_A3, A4 RIO_A4, A5 RIO_A5, A6 RIO_A6, A7 RIO_A7, A8 RIO_A8, A9 RIO_A9, A10 RIO_A10, A11 RIO_A11, A12 RIO_A12, A13 RIO_A13, A14 RIO_A14, A15 RIO_A15, A16 RIO_A16, A17 RIO_A17, A18 RIO_A18, A19 RIO_A19, A20 RIO_A20, A21 RIO_A21, A22 RIO_A22, A23 RIO_A23, A24 RIO_A24, A25 RIO_A25, A26 RIO_A26, A27 RIO_A27, A28 RIO_A28, A29 RIO_A29, A30 RIO_A30, A31 RIO_A31, A32 RIO_A32
part B pins: B1 +5VDC, B2 GND, B3 ~{RETRY}, B4 A24, B5 A25, B6 A26, B7 A27, B8 A28, B9 A29, B10 A30, B11 A31, B12 GND, B13 +5VDC, B14 D16, B15 D17, B16 D18, B17 D19, B18 D20, B19 D21, B20 D22, B21 D23, B22 GND, B23 D24, B24 D25, B25 D26, B26 D27, B27 D28, B28 D29, B29 D30, B30 D31, B31 GND, B32 +5VDC
part C pins: 0 HL, C1 RIO_C1, C2 RIO_C2, C3 RIO_C3, C4 RIO_C4, C5 RIO_C5, C6 RIO_C6, C7 RIO_C7, C8 RIO_C8, C9 RIO_C9, C10 RIO_C10, C11 RIO_C11, C12 RIO_C12, C13 RIO_C13, C14 RIO_C14, C15 RIO_C15, C16 RIO_C16, C17 RIO_C17, C18 RIO_C18, C19 RIO_C19, C20 RIO_C20, C21 RIO_C21, C22 RIO_C22, C23 RIO_C23, C24 RIO_C24, C25 RIO_C25, C26 RIO_C26, C27 RIO_C27, C28 RIO_C28, C29 RIO_C29, C30 RIO_C30, C31 RIO_C31, C32 RIO_C32
part D pins: D1 CLK100P, D2 CLK100N, D3 GND, D4 INP, D5 INN, D6 GND, D7 OUTP, D8 OUTN, D9 GND, D10 SYNCP, D11 SYNCN, D12 GND, D13 CLK10P, D14 CLK10N, D15 GND, D16 Reserved, D17 DZ_O0, D18 Reserved, D19 DZ_O1, D20 Reserved, D21 DZ_O2, D22 Reserved, D23 DZ_O3, D24 Reserved, D25 DZ_O4, D26 Reserved, D27 DZ_O5, D28 Reserved, D29 DZ_O6, D30 DZ_O7, D31 GND, D32 VPC
part E pins: Z1 TTL0, Z2 GND, Z3 TTL1, Z4 GND, Z5 TTL2, Z6 GND, Z7 TTL3, Z8 GND, Z9 TTL4, Z10 GND, Z11 TTL5, Z12 GND, Z13 TTL6, Z14 GND, Z15 TTL7, Z16 GND, Z17 DZ_I0, Z18 GND, Z19 DZ_I1, Z20 GND, Z21 DZ_I2, Z22 GND, Z23 DZ_I3, Z24 GND, Z25 DZ_I4, Z26 GND, Z27 DZ_I5, Z28 GND, Z29 DZ_I6, Z30 GND, Z31 DZ_I7, Z32 GND

## XTAL_CX3225SB48
designator XC?, comment value 48 MHz  (hidden comment: CX3225SB48000D0WPSC1)
Kyocera XTAL 48MHz CX3225SB48000D0WPSC1; Pkg: 4 pin SMD; Maintainer: Evgeniy Kotov; SMD Solders: 4; THD Solders: 0; PartField: CX3225SB48000D0WPSC1; Vendor: Kyocera; Release Date: 06.03.2017; Last Change Data: 09.03.2017
footprint SMD3225_4PIN_XTAL
pins: 1 XTAL+, 2 SLD, 3 XTAL-, 4 SLD